# Altium integrated library RL2.IntLib: 663 symbols (part 2 of 4) (continued)
## MMBT2907ALT1 (continued)
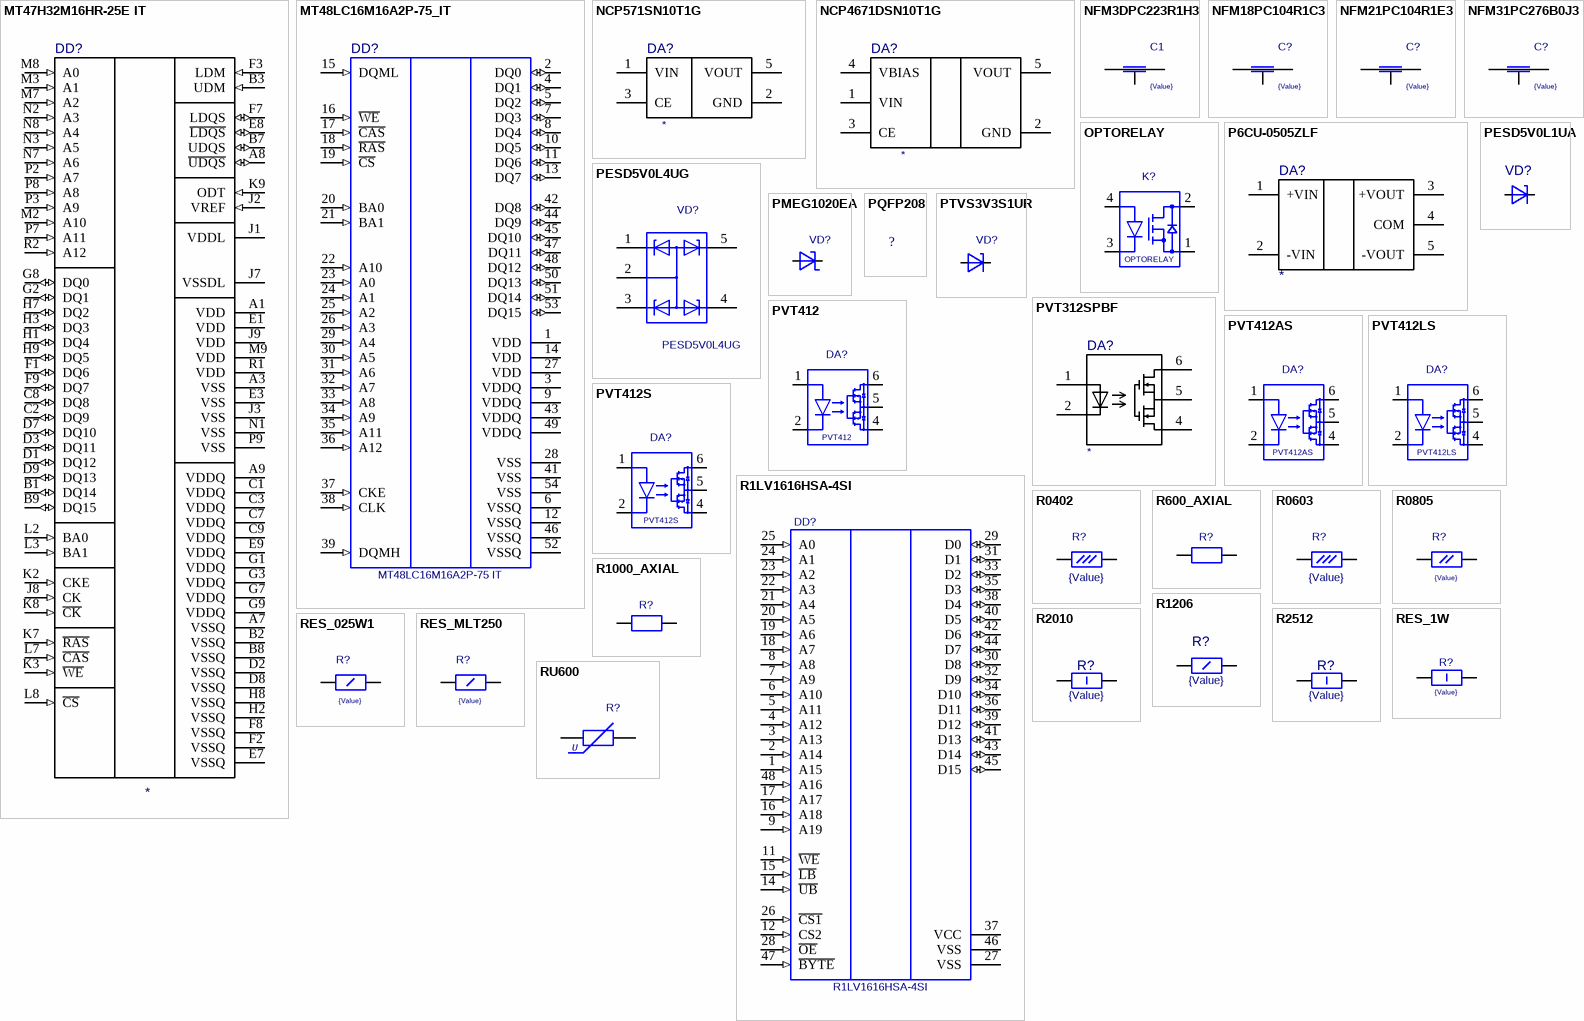
[diagram p16: symbols MT47H32M16HR-25E IT to RU600]

## MT47H32M16HR-25E IT
designator DD?
footprint FBGA-84
signal-integrity model MT47H32M16HR
pins: A1 VDD (power), A3 VSS (power), A7 VSSQ (power), A8 ~{UDQS} (io), A9 VDDQ (power), B1 DQ14 (io), B2 VSSQ (power), B3 UDM (in), B7 UDQS (io), B8 VSSQ (power), B9 DQ15 (io), C1 VDDQ (power), C2 DQ9 (io), C3 VDDQ (power), C7 VDDQ (power), C8 DQ8 (io), C9 VDDQ (power), D1 DQ12 (io), D2 VSSQ (power), D3 DQ11 (io), D7 DQ10 (io), D8 VSSQ (power), D9 DQ13 (io), E1 VDD (power), E3 VSS (power), E7 VSSQ (power), E8 ~{LDQS} (io), E9 VDDQ (power), F1 DQ6 (io), F2 VSSQ (power), F3 LDM (in), F7 LDQS (io), F8 VSSQ (power), F9 DQ7 (io), G1 VDDQ (power), G2 DQ1 (io), G3 VDDQ (power), G7 VDDQ (power), G8 DQ0 (io), G9 VDDQ (power), H1 DQ4 (io), H2 VSSQ (power), H3 DQ3 (io), H7 DQ2 (io), H8 VSSQ (power), H9 DQ5 (io), J1 VDDL (power), J2 VREF (in), J3 VSS (power), J7 VSSDL (power), J8 CK (in), J9 VDD (power), K2 CKE (in), K3 ~{WE} (in), K7 ~{RAS} (in), K8 ~{CK} (in), K9 ODT (in), L2 BA0 (in), L3 BA1 (in), L7 ~{CAS} (in), L8 ~{CS} (in), M2 A10 (in), M3 A1 (in), M7 A2 (in), M8 A0 (in), M9 VDD (power), N1 VSS (power), N2 A3 (in), N3 A5 (in), N7 A6 (in), N8 A4 (in), P2 A7 (in), P3 A9 (in), P7 A11 (in), P8 A8 (in), P9 VSS, R1 VDD (power), R2 A12 (in)

## MT48LC16M16A2P-75_IT
designator DD?, comment MT48LC16M16A2P-75 IT
MT48LC16M16A2P-75_IT; RowAddress: 8K (A0-A12); ColumnAddress: 512 (A0-A8); ComponentLink2DescA4: Datasheet; CycleTime: 7.5ns @ CL = 3 (PC133); ComponentLink1DescBC: Manufacturer Link; Published: 11-Oct-2004; PackageDocument: Sep-2003; PackageReference: TSOP2-54; Publisher: Altium Limited; Code_JEDEC: MS-024-FA; DatasheetDocument: rev.G, Sep-2003; ComponentLink1URL: http://www.micron.com; ComponentLink2URL: http://download.micron.com/pdf/datasheets/dram/sdram/256MSDRAM.pdf; Value: *
footprint TSOP2-54 (Footprint not found)
signal-integrity model MT48LC16M16A2TG IBIS (Model Description)
pins: 1 VDD (power), 2 DQ0 (io), 3 VDDQ (power), 4 DQ1 (io), 5 DQ2 (io), 6 VSSQ (power), 7 DQ3 (io), 8 DQ4 (io), 9 VDDQ (power), 10 DQ5 (io), 11 DQ6 (io), 12 VSSQ (power), 13 DQ7 (io), 14 VDD (power), 15 DQML (in), 16 ~{WE} (in), 17 ~{CAS} (in), 18 ~{RAS} (in), 19 ~{CS} (in), 20 BA0 (in), 21 BA1 (in), 22 A10 (in), 23 A0 (in), 24 A1 (in), 25 A2 (in), 26 A3 (in), 27 VDD (power), 28 VSS (power), 29 A4 (in), 30 A5 (in), 31 A6 (in), 32 A7 (in), 33 A8 (in), 34 A9 (in), 35 A11 (in), 36 A12 (in), 37 CKE (in), 38 CLK (in), 39 DQMH (in), 41 VSS (power), 42 DQ8 (io), 43 VDDQ (power), 44 DQ9 (io), 45 DQ10 (io), 46 VSSQ (power), 47 DQ11 (io), 48 DQ12 (io), 49 VDDQ (power), 50 DQ13 (io), 51 DQ14 (io), 52 VSSQ (power), 53 DQ15 (io), 54 VSS (power)

## NCP571SN10T1G
designator DA?
footprint SOT23-5
pins: 1 VIN, 2 GND, 3 CE, 5 VOUT

## NCP4671DSN10T1G
designator DA?
footprint SOT23-5
pins: 1 VIN, 2 GND, 3 CE, 4 VBIAS, 5 VOUT

## NFM3DPC223R1H3
designator C1  value {Value}  (hidden comment: *)
NFM3DPC223R1H3
footprint C3T1206
pins: 1, 2, 3

## NFM18PC104R1C3
designator C?  value {Value}  (hidden comment: *)
NFM18PC104R1C3
footprint C3T0603
pins: 1, 2, 3

## NFM21PC104R1E3
designator C?  value {Value}  (hidden comment: *)
NFM21PC104R1E3
footprint C3T0805
pins: 1, 2, 3

## NFM31PC276B0J3
designator C?  value {Value}  (hidden comment: *)
NFM31PC276B0J3
footprint C3T1206
pins: 1, 2, 3

## OPTORELAY
designator K?
Value: *
footprint 5П20. -А1
pins: 1 E0, 2 C0, 3 E0, 4 C0

## P6CU-0505ZLF
designator DA?
footprint DC-DC SIP7
pins: 1 +VIN, 2 -VIN, 3 +VOUT, 4 COM, 5 -VOUT, 6 hidden

## PESD5V0L1UA
designator VD?  (value not drawn)
footprint SOD323 (SC-76)
pins: 1, 2

## PESD5V0L4UG
designator VD?
Value: *
footprint SOT353/SC-88A
pins: 1, 2, 3, 4, 5

## PMEG1020EA
designator VD?  (value not drawn)
PMEG1020EA; Value: *
footprint SOD323 (SC-76)
pins: 1, 2

## PQFP208
designator ?  (value not drawn)
PQFP208; Value: *
footprint PQFP208
pins: 1 hidden, 2 hidden, 3 hidden, 4 hidden, 5 hidden, 6 hidden, 7 hidden, 8 hidden, 9 hidden, 10 hidden, 11 hidden, 12 hidden, 13 hidden, 14 hidden, 15 hidden, 16 hidden, 17 hidden, 18 hidden, 19 hidden, 20 hidden, 21 hidden, 22 hidden, 23 hidden, 24 hidden, 25 hidden, 26 hidden, 27 hidden, 28 hidden, 29 hidden, 30 hidden, 31 hidden, 32 hidden, 33 hidden, 34 hidden, 35 hidden, 36 hidden, 37 hidden, 38 hidden, 39 hidden, 40 hidden, 41 hidden, 42 hidden, 43 hidden, 44 hidden, 45 hidden, 46 hidden, 47 hidden, 48 hidden, 49 hidden, 50 hidden, 51 hidden, 52 hidden, 53 hidden, 54 hidden, 55 hidden, 56 hidden, 57 hidden, 58 hidden, 59 hidden, 60 hidden, 61 hidden, 62 hidden, 63 hidden, 64 hidden, 65 hidden, 66 hidden, 67 hidden, 68 hidden, 69 hidden, 70 hidden, 71 hidden, 72 hidden, 73 hidden, 74 hidden, 75 hidden, 76 hidden, 77 hidden, 78 hidden, 79 hidden, 80 hidden, 81 hidden, 82 hidden, 83 hidden, 84 hidden, 85 hidden, 86 hidden, 87 hidden, 88 hidden, 89 hidden, 90 hidden, 91 hidden, 92 hidden, 93 hidden, 94 hidden, 95 hidden, 96 hidden, 97 hidden, 98 hidden, 99 hidden, 100 hidden, 101 hidden, 102 hidden, 103 hidden, 104 hidden, 105 hidden, 106 hidden, 107 hidden, 108 hidden, 109 hidden, 110 hidden, 111 hidden, 112 hidden, 113 hidden, 114 hidden, 115 hidden, 116 hidden, 117 hidden, 118 hidden, 119 hidden, 120 hidden, 121 hidden, 122 hidden, 123 hidden, 124 hidden, 125 hidden, 126 hidden, 127 hidden, 128 hidden, 129 hidden, 130 hidden, 131 hidden, 132 hidden, 133 hidden, 134 hidden, 135 hidden, 136 hidden, 137 hidden, 138 hidden, 139 hidden, 140 hidden, 141 hidden, 142 hidden, 143 hidden, 144 hidden, 145 hidden, 146 hidden, 147 hidden, 148 hidden, 149 hidden, 150 hidden, 151 hidden, 152 hidden, 153 hidden, 154 hidden, 155 hidden, 156 hidden, 157 hidden, 158 hidden, 159 hidden, 160 hidden, 161 hidden, 162 hidden, 163 hidden, 164 hidden, 165 hidden, 166 hidden, 167 hidden, 168 hidden, 169 hidden, 170 hidden, 171 hidden, 172 hidden, 173 hidden, 174 hidden, 175 hidden, 176 hidden, 177 hidden, 178 hidden, 179 hidden, 180 hidden, 181 hidden, 182 hidden, 183 hidden, 184 hidden, 185 hidden, 186 hidden, 187 hidden, 188 hidden, 189 hidden, 190 hidden, 191 hidden, 192 hidden, 193 hidden, 194 hidden, 195 hidden, 196 hidden, 197 hidden, 198 hidden, 199 hidden, 200 hidden, 201 hidden, 202 hidden, 203 hidden, 204 hidden, 205 hidden, 206 hidden, 207 hidden, 208 hidden

## PTVS3V3S1UR
designator VD?  (value not drawn)
Value: *
footprint SOD123W
pins: 1, 2

## PVT312SPBF
designator DA?
footprint DIP6 SMD
pins: 1, 2, 4, 5, 6

## PVT412
designator DA?
Value: *
footprint SMT 6-PIN
pins: 1, 2, 3 hidden, 4, 5, 6

## PVT412AS
designator DA?
Value: *
footprint SMT 6-PIN
pins: 1, 2, 3 hidden, 4, 5, 6

## PVT412LS
designator DA?
Value: *
footprint SMT 6-PIN
pins: 1, 2, 3 hidden, 4, 5, 6

## PVT412S
designator DA?
Value: *
footprint SMT 6-PIN
pins: 1, 2, 3 hidden, 4, 5, 6

## R1LV1616HSA-4SI
designator DD?
Value: *
footprint TSSO12X20-G48/P.5
signal-integrity model Model Name (Model Description)
pins: 1 A15 (in), 2 A14 (in), 3 A13 (in), 4 A12 (in), 5 A11 (in), 6 A10 (in), 7 A9 (in), 8 A8 (in), 9 A19 (in), 11 ~{WE} (in), 12 CS2 (in), 14 ~{UB} (in), 15 ~{LB} (in), 16 A18 (in), 17 A17 (in), 18 A7 (in), 19 A6 (in), 20 A5 (in), 21 A4 (in), 22 A3 (in), 23 A2 (in), 24 A1 (in), 25 A0 (in), 26 ~{CS1} (in), 27 VSS (power), 28 ~{OE} (in), 29 D0 (io), 30 D8 (io), 31 D1 (io), 32 D9 (io), 33 D2 (io), 34 D10 (io), 35 D3 (io), 36 D11 (io), 37 VCC (power), 38 D4 (io), 39 D12 (io), 40 D5 (io), 41 D13 (io), 42 D6 (io), 43 D14 (io), 44 D7 (io), 45 D15 (io), 46 VSS (power), 47 ~{BYTE} (in), 48 A16 (in)

## R0402
designator R?  value {Value}  (hidden comment: *)
R0402
footprint R0402
signal-integrity model resistor (Model Description)
pins: 1, 2

## R600_AXIAL
designator R?  (value not drawn)
R600_AXIAL; Value: {Value}
footprint R600AXIAL
pins: 1, 2

## R0603
designator R?  value {Value}  (hidden comment: *)
R0603
footprint R0603
signal-integrity model resistor (Model Description)
pins: 1, 2

## R0805
designator R?  value {Value}  (hidden comment: *)
R0805
footprint R0805
pins: 1 Pin1, 2 Pin2

## R1000_AXIAL
designator R?  (value not drawn)
R1000_AXIAL; Value: {Value}
footprint R1000_AXIAL_3W
footprint R1000_AXIAL_Primary
pins: 1, 2

## R1206
designator R?  value {Value}  (hidden comment: *)
R1206
footprint R1206
pins: 1, 2

## R2010
designator R?  value {Value}  (hidden comment: *)
R2010
footprint R2010
pins: 1, 2

## R2512
designator R?  value {Value}  (hidden comment: *)
R2512
footprint R2512
pins: 1 Pin1, 2 Pin2

## RES_1W
designator R?  value {Value}  (hidden comment: *)
RES_1W
footprint R2512
pins: 1 Pin1, 2 Pin2

## RES_025W1
designator R?  value {Value}  (hidden comment: *)
RES_025W1
footprint R1206
pins: 1 Pin1, 2 Pin2

## RES_MLT250
designator R?  value {Value}  (hidden comment: *)
RES_MLT250
footprint RES400
pins: 1, 2

## RU600
designator R?  (value not drawn)
RU600; Value: {Value}
footprint RU400
pins: 1, 2
text: U

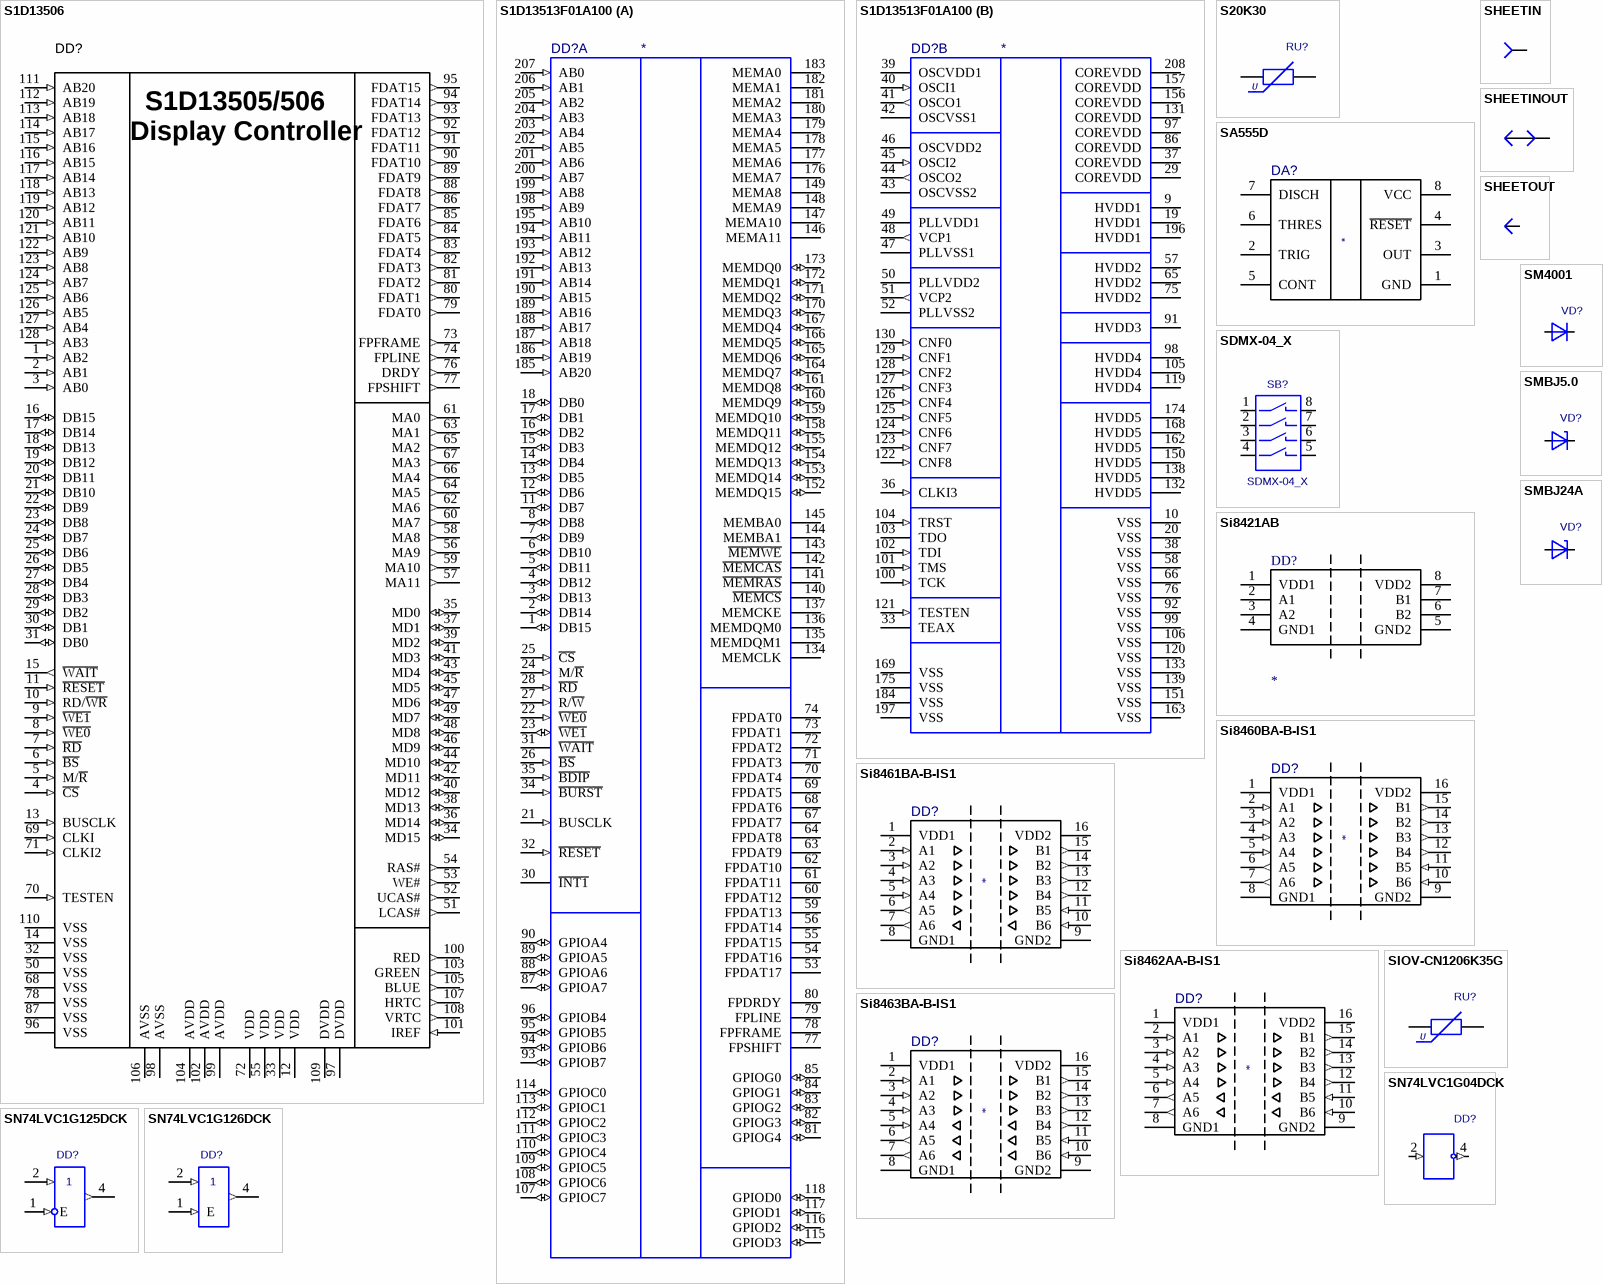
[diagram p17: symbols S1D13506 to SN74LVC1G126DCK]

## S1D13506
designator DD?, comment S1D13806F00A200  (value not drawn)
FAB: EPSON; TEMP: 0°C а 70°C; BOI: QFP144; DESIG: Embedded Memory display controller; DEV: QFP144_07; REF: S1D13806F00A200; VAL: S1D13806F00A200
footprint F-QFP20x20-G144/N (144-Pin Plastic Quad Flat Pack (TQFP))
footprint QFP144_07
footprint F-QFP14x14-G128/N (QFP; 128 Leads; Body 14 x 14 mm; Pitch 0.4 mm)
signal-integrity model S1D13506 (Model Description)
pins: 1 AB2 (in), 2 AB1 (in), 3 AB0 (in), 4 ~{CS} (in), 5 M/~{R} (in), 6 ~{BS} (in), 7 ~{RD} (in), 8 ~{WE0} (in), 9 ~{WE1} (in), 10 RD/~{WR} (in), 11 ~{RESET} (in), 12 VDD (power), 13 BUSCLK (in), 14 VSS (power), 15 ~{WAIT} (out), 16 DB15 (io), 17 DB14 (io), 18 DB13 (io), 19 DB12 (io), 20 DB11 (io), 21 DB10 (io), 22 DB9 (io), 23 DB8 (io), 24 DB7 (io), 25 DB6 (io), 26 DB5 (io), 27 DB4 (io), 28 DB3 (io), 29 DB2 (io), 30 DB1 (io), 31 DB0 (io), 32 VSS (power), 33 VDD (power), 34 MD15 (io), 35 MD0 (io), 36 MD14 (io), 37 MD1 (io), 38 MD13 (io), 39 MD2 (io), 40 MD12 (io), 41 MD3 (io), 42 MD11 (io), 43 MD4 (io), 44 MD10 (io), 45 MD5 (io), 46 MD9 (io), 47 MD6 (io), 48 MD8 (io), 49 MD7 (io), 50 VSS (power), 51 LCAS# (out), 52 UCAS# (out), 53 WE# (out), 54 RAS# (out), 55 VDD (power), 56 MA9 (out), 57 MA11 (out), 58 MA8 (out), 59 MA10 (out), 60 MA7 (out), 61 MA0 (out), 62 MA6 (out), 63 MA1 (out), 64 MA5 (out), 65 MA2 (out), 66 MA4 (out), 67 MA3 (out), 68 VSS (power), 69 CLKI (in), 70 TESTEN (in), 71 CLKI2 (in), 72 VDD (power), 73 FPFRAME (out), 74 FPLINE (out), 76 DRDY (out), 77 FPSHIFT (out), 78 VSS (power), 79 FDAT0 (out), 80 FDAT1 (out), 81 FDAT2 (out), 82 FDAT3 (out), 83 FDAT4 (out), 84 FDAT5 (out), 85 FDAT6 (out), 86 FDAT7 (out), 87 VSS (power), 88 FDAT8 (out), 89 FDAT9 (out), 90 FDAT10 (out), 91 FDAT11 (out), 92 FDAT12 (out), 93 FDAT13 (out), 94 FDAT14 (out), 95 FDAT15 (out), 96 VSS (power), 97 DVDD (power), 98 AVSS (power), 99 AVDD (power), 100 RED (out), 101 IREF (in), 102 AVDD (power), 103 GREEN (out), 104 AVDD (power), 105 BLUE (out), 106 AVSS (power), 107 HRTC (out), 108 VRTC (out), 109 DVDD (power), 110 VSS (power), 111 AB20 (in), 112 AB19 (in), 113 AB18 (in), 114 AB17 (in), 115 AB16 (in), 116 AB15 (in), 117 AB14 (in), 118 AB13 (in), 119 AB12 (in), 120 AB11 (in), 121 AB10 (in), 122 AB9 (in), 123 AB8 (in), 124 AB7 (in), 125 AB6 (in), 126 AB5 (in), 127 AB4 (in), 128 AB3 (in)
text: S1D13505/506; Display Controller

## S1D13513F01A100
designator DD?
signal-integrity model S1D13513F
footprint QFP22-208
part A pins: 1 DB15 (io), 2 DB14 (io), 3 DB13 (io), 4 DB12 (io), 5 DB11 (io), 6 DB10 (io), 7 DB9 (io), 8 DB8 (io), 11 DB7 (io), 12 DB6 (io), 13 DB5 (io), 14 DB4 (io), 15 DB3 (io), 16 DB2 (io), 17 DB1 (io), 18 DB0 (io), 21 BUSCLK (in), 22 ~{WE0} (in), 23 ~{WE1} (io), 24 M/~{R} (in), 25 ~{CS} (in), 26 ~{BS} (in), 27 R/~{W} (in), 28 ~{RD} (in), 30 ~{INT1} (hiz), 31 ~{WAIT} (hiz), 32 ~{RESET} (in), 34 ~{BURST} (in), 35 ~{BDIP} (in), 53 FPDAT17 (hiz), 54 FPDAT16 (hiz), 55 FPDAT15 (hiz), 56 FPDAT14 (hiz), 59 FPDAT13 (hiz), 60 FPDAT12 (hiz), 61 FPDAT11 (hiz), 62 FPDAT10 (hiz), 63 FPDAT9 (hiz), 64 FPDAT8 (hiz), 67 FPDAT7 (hiz), 68 FPDAT6 (hiz), 69 FPDAT5 (hiz), 70 FPDAT4 (hiz), 71 FPDAT3 (hiz), 72 FPDAT2 (hiz), 73 FPDAT1 (hiz), 74 FPDAT0 (hiz), 77 FPSHIFT (hiz), 78 FPFRAME (hiz), 79 FPLINE (hiz), 80 FPDRDY (hiz), 81 GPIOG4 (io), 82 GPIOG3 (io), 83 GPIOG2 (io), 84 GPIOG1 (io), 85 GPIOG0 (io), 87 GPIOA7 (io), 88 GPIOA6 (io), 89 GPIOA5 (io), 90 GPIOA4 (io), 93 GPIOB7 (io), 94 GPIOB6 (io), 95 GPIOB5 (io), 96 GPIOB4 (io), 107 GPIOC7 (io), 108 GPIOC6 (io), 109 GPIOC5 (io), 110 GPIOC4 (io), 111 GPIOC3 (io), 112 GPIOC2 (io), 113 GPIOC1 (io), 114 GPIOC0 (io), 115 GPIOD3 (io), 116 GPIOD2 (io), 117 GPIOD1 (io), 118 GPIOD0 (io), 134 MEMCLK (hiz), 135 MEMDQM1 (hiz), 136 MEMDQM0 (hiz), 137 MEMCKE (hiz), 140 ~{MEMCS} (hiz), 141 ~{MEMRAS} (hiz), 142 ~{MEMCAS} (hiz), 143 ~{MEMWE} (hiz), 144 MEMBA1 (hiz), 145 MEMBA0 (hiz), 146 MEMA11 (hiz), 147 MEMA10 (hiz), 148 MEMA9 (hiz), 149 MEMA8 (hiz), 152 MEMDQ15 (io), 153 MEMDQ14 (io), 154 MEMDQ13 (io), 155 MEMDQ12 (io), 158 MEMDQ11 (io), 159 MEMDQ10 (io), 160 MEMDQ9 (io), 161 MEMDQ8 (io), 164 MEMDQ7 (io), 165 MEMDQ6 (io), 166 MEMDQ5 (io), 167 MEMDQ4 (io), 170 MEMDQ3 (io), 171 MEMDQ2 (io), 172 MEMDQ1 (io), 173 MEMDQ0 (io), 176 MEMA7 (hiz), 177 MEMA6 (hiz), 178 MEMA5 (hiz), 179 MEMA4 (hiz), 180 MEMA3 (hiz), 181 MEMA2 (hiz), 182 MEMA1 (hiz), 183 MEMA0 (hiz), 185 AB20 (in), 186 AB19 (in), 187 AB18 (in), 188 AB17 (in), 189 AB16 (in), 190 AB15 (in), 191 AB14 (in), 192 AB13 (in), 193 AB12 (in), 194 AB11 (in), 195 AB10 (in), 198 AB9 (in), 199 AB8 (in), 200 AB7 (in), 201 AB6 (in), 202 AB5 (in), 203 AB4 (in), 204 AB3 (in), 205 AB2 (in), 206 AB1 (in), 207 AB0 (in)
part B pins: 9 HVDD1 (power), 10 VSS (power), 19 HVDD1 (power), 20 VSS (power), 29 COREVDD (power), 33 TEAX (hiz), 36 CLKI3 (in), 37 COREVDD (power), 38 VSS (power), 39 OSCVDD1 (power), 40 OSCI1 (in), 41 OSCO1 (out), 42 OSCVSS1 (power), 43 OSCVSS2 (power), 44 OSCO2 (out), 45 OSCI2 (in), 46 OSCVDD2 (power), 47 PLLVSS1 (power), 48 VCP1 (out), 49 PLLVDD1 (power), 50 PLLVDD2 (power), 51 VCP2 (out), 52 PLLVSS2 (power), 57 HVDD2 (power), 58 VSS (power), 65 HVDD2 (power), 66 VSS (power), 75 HVDD2 (power), 76 VSS (power), 86 COREVDD (power), 91 HVDD3 (power), 92 VSS (power), 97 COREVDD (power), 98 HVDD4 (power), 99 VSS (power), 100 TCK (in), 101 TMS (in), 102 TDI (in), 103 TDO (hiz), 104 TRST (in), 105 HVDD4 (power), 106 VSS (power), 119 HVDD4 (power), 120 VSS (power), 121 TESTEN (in), 122 CNF8 (in), 123 CNF7 (in), 124 CNF6 (in), 125 CNF5 (in), 126 CNF4 (in), 127 CNF3 (in), 128 CNF2 (in), 129 CNF1 (in), 130 CNF0 (in), 131 COREVDD (power), 132 HVDD5 (power), 133 VSS (power), 138 HVDD5 (power), 139 VSS (power), 150 HVDD5 (power), 151 VSS (power), 156 COREVDD (power), 157 COREVDD (power), 162 HVDD5 (power), 163 VSS (power), 168 HVDD5 (power), 169 VSS (power), 174 HVDD5 (power), 175 VSS (power), 184 VSS (power), 196 HVDD1 (power), 197 VSS (power), 208 COREVDD (power)

## S20K30
designator RU?  (value not drawn)
S20K30; Value: {Value}
footprint VARISTOR
pins: 1, 2
text: U

## SA555D
designator DA?
footprint SOIC8 JEDEC
pins: 1 GND, 2 TRIG, 3 OUT, 4 ~{RESET}, 5 CONT, 6 THRES, 7 DISCH, 8 VCC

## SDMX-04_X
designator SB?
Value: *
footprint SDMX_04_X
pins: 1 S3_1, 2 S3_2, 3 S1_1, 4 S2_1, 5 S4_1, 6 S4_2, 7 S2_2, 8 S1_2

## SHEETIN
designator ?  (value not drawn)
SHEETIN; Value: *
pins: 0

## SHEETINOUT
designator ?  (value not drawn)
SHEETINOUT; Value: *
pins: 0

## SHEETOUT
designator ?  (value not drawn)
SHEETOUT; Value: *
pins: 0

## Si8421AB
designator DD?
footprint SOIC8 JEDEC
pins: 1 VDD1, 2 A1, 3 A2, 4 GND1, 5 GND2, 6 B2, 7 B1, 8 VDD2

## Si8460BA-B-IS1
designator DD?
footprint SOIC16
pins: 1 VDD1 (power), 2 A1 (in), 3 A2 (in), 4 A3 (in), 5 A4 (in), 6 A5 (out), 7 A6 (out), 8 GND1 (power), 9 GND2 (power), 10 B6 (in), 11 B5 (in), 12 B4 (out), 13 B3 (out), 14 B2 (out), 15 B1 (out), 16 VDD2 (power)

## Si8461BA-B-IS1
designator DD?
footprint SOIC16
pins: 1 VDD1 (power), 2 A1 (in), 3 A2 (in), 4 A3 (in), 5 A4 (in), 6 A5 (out), 7 A6 (out), 8 GND1 (power), 9 GND2 (power), 10 B6 (in), 11 B5 (in), 12 B4 (out), 13 B3 (out), 14 B2 (out), 15 B1 (out), 16 VDD2 (power)

## Si8462AA-B-IS1
designator DD?
footprint SOIC16
pins: 1 VDD1 (power), 2 A1 (in), 3 A2 (in), 4 A3 (in), 5 A4 (in), 6 A5 (out), 7 A6 (out), 8 GND1 (power), 9 GND2 (power), 10 B6 (in), 11 B5 (in), 12 B4 (out), 13 B3 (out), 14 B2 (out), 15 B1 (out), 16 VDD2 (power)

## Si8463BA-B-IS1
designator DD?
footprint SOIC16
pins: 1 VDD1 (power), 2 A1 (in), 3 A2 (in), 4 A3 (in), 5 A4 (in), 6 A5 (out), 7 A6 (out), 8 GND1 (power), 9 GND2 (power), 10 B6 (in), 11 B5 (in), 12 B4 (out), 13 B3 (out), 14 B2 (out), 15 B1 (out), 16 VDD2 (power)